# Altium footprint library PLC1.PcbLib: 122 footprints (part 8 of 8)
Each footprint in its own frame and in the unit in brackets; x right, y up, seen from the top. Pads: shape width x height; smd on the part's side, far side on the other; paste and mask are expansions set on the pad; w line width, h text height; cw(c..) or ccw(c..) is an arc to the next point about the centre after c.
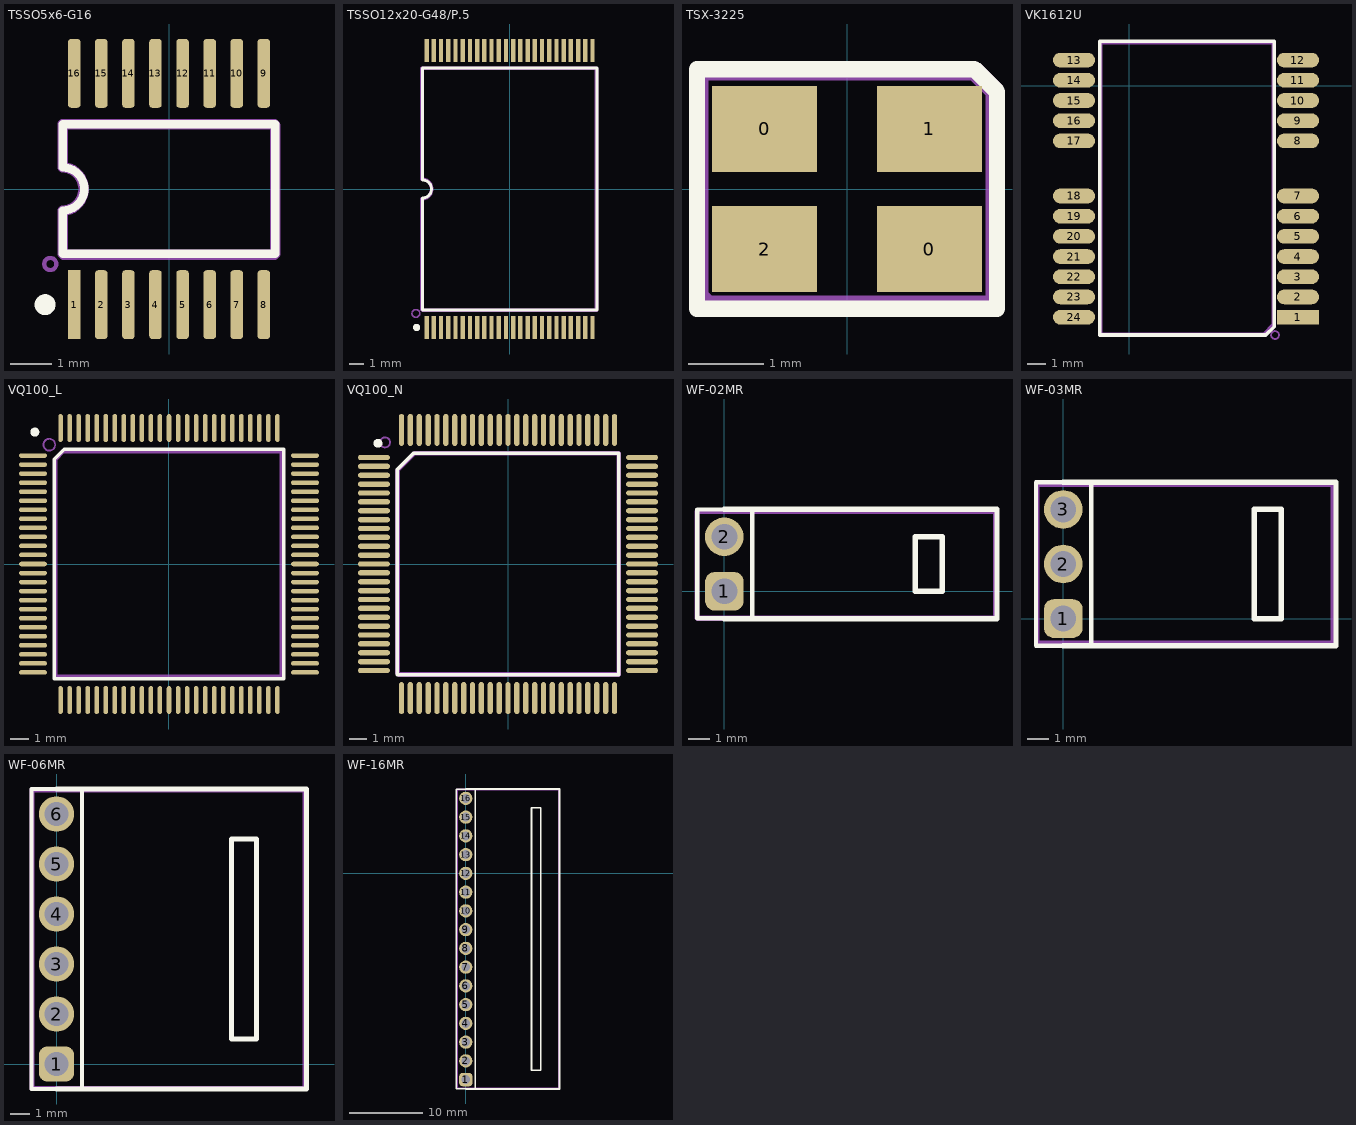
[diagram p7: the footprints below, top view; thin cyan lines are the x and y axes]

## TSSO5x6-G16 [mm] "Shrink Small Outline; 16 Leads; Body Width 4.4 mm; Pitch 0.65 mm"
height 1.1
pads (16):
  rect 0.3x1.65 smd: 1(-2.275,-2.775)
  rrect50% 0.3x1.65 smd: 2(-1.625,-2.775) 3(-0.975,-2.775) 4(-0.325,-2.775) 5(0.325,-2.775) 6(0.975,-2.775) 7(1.625,-2.775) 8(2.275,-2.775) 9(2.275,2.775) 10(1.625,2.775) 11(0.975,2.775) 12(0.325,2.775) 13(-0.325,2.775) 14(-0.975,2.775) 15(-1.625,2.775) 16(-2.275,2.775)
Top Overlay:
  circle w0.25: c-2.975,-2.775 r0.125
  lines w0.2: -2.55,-1.55 -2.55,-0.517 ccw(c-2.55,0) -2.55,0.517 -2.55,1.55 2.55,1.55 2.55,-1.55 -2.55,-1.55
Top Assy:
  circle w0.1: c-2.85,-1.8 r0.146
  lines w0.254: -2.55,-1.55 -2.55,-0.525 ccw(c-2.576,0) -2.55,0.525 -2.55,1.55 2.525,1.55 2.55,1.525 2.55,-1.55 2.525,-1.575 -2.525,-1.575 -2.55,-1.55
  text ".Designator" at -2.3,-1.075 h0.7
3D body "User Library-TSSOP-16.step": height 1, standoff 0, extent -2.5,-3.175 2.5,3.225

## TSSO12x20-G48/P.5 [mm] "Shrink Small Outline; 48 Leads; Body Width 18.4 mm; Pitch 0.5 mm"
height 1.2
pads (48):
  rect 0.3x1.6 smd: 1(-5.75,-9.6) 2(-5.25,-9.6) 3(-4.75,-9.6) 4(-4.25,-9.6) 5(-3.75,-9.6) 6(-3.25,-9.6) 7(-2.75,-9.6) 8(-2.25,-9.6) 9(-1.75,-9.6) 10(-1.25,-9.6) 11(-0.75,-9.6) 12(-0.25,-9.6) 13(0.25,-9.6) 14(0.75,-9.6) 15(1.25,-9.6) 16(1.75,-9.6) 17(2.25,-9.6) 18(2.75,-9.6) 19(3.25,-9.6) 20(3.75,-9.6) 21(4.25,-9.6) 22(4.75,-9.6) 23(5.25,-9.6) 24(5.75,-9.6) 25(5.75,9.6) 26(5.25,9.6) 27(4.75,9.6) 28(4.25,9.6) 29(3.75,9.6) 30(3.25,9.6) 31(2.75,9.6) 32(2.25,9.6) 33(1.75,9.6) 34(1.25,9.6) 35(0.75,9.6) 36(0.25,9.6) 37(-0.25,9.6) 38(-0.75,9.6) 39(-1.25,9.6) 40(-1.75,9.6) 41(-2.25,9.6) 42(-2.75,9.6) 43(-3.25,9.6) 44(-3.75,9.6) 45(-4.25,9.6) 46(-4.75,9.6) 47(-5.25,9.6) 48(-5.75,9.6)
Top Overlay:
  circle w0.25: c-6.45,-9.6 r0.125
  lines w0.2: -6.05,-8.4 6.05,-8.4 6.05,8.4 -6.05,8.4 -6.05,0.635 cw(c-6.05,0) -6.05,-0.635 -6.05,-8.4
Top Assy:
  circle w0.1: c-6.5,-8.625 r0.27
  lines w0.254: -6.075,-8.35 -6.025,-8.4 6.025,-8.4 6.025,8.35 6,8.375 -6.075,8.375 -6.075,0.675 cw(c-6.075,0) -6.075,-0.675 -6.075,-8.35
  text ".Designator" at -3.15,-0.25 h0.7
3D body "User Library-TSOP48.step": height 1.2, standoff -0.06, extent -6.05,-10.05 6.05,10.05

## TSX-3225 [mm]
height 1.5
pads (4):
  rect 1.4x1.15 smd: 0(-1.1,0.8) 0(1.1,-0.8) 1(1.1,0.8) 2(-1.1,-0.8)
Top Overlay:
  lines w0.22: -2,-1.6 2,-1.6 2,1.3 1.7,1.6 -2,1.6 -2,-1.6
Top Assy:
  lines w0.254: -1.975,-1.425 -1.85,-1.55 1.925,-1.55 1.975,-1.5 1.975,1.3 1.7,1.575 -1.975,1.575 -1.975,-1.425
  text ".Designator" at -1.725,-0.275 h0.7
3D body "User Library-tsx-3225-1.step": height 0.6, standoff 0, extent -1.625,-1.25 1.575,1.25

## VK1612U [mm]
pads (24):
  rect 2.3x0.8 smd: 1(9.2,-12.6)
  oval 2.3x0.8 smd: 2(9.2,-11.5) 3(9.2,-10.4) 4(9.2,-9.3) 5(9.2,-8.2) 6(9.2,-7.1) 7(9.2,-6) 8(9.2,-3) 9(9.2,-1.9) 10(9.2,-0.8) 11(9.2,0.3) 12(9.2,1.4) 13(-3,1.4) 14(-3,0.3) 15(-3,-0.8) 16(-3,-1.9) 17(-3,-3) 18(-3,-6) 19(-3,-7.1) 20(-3,-8.2) 21(-3,-9.3) 22(-3,-10.4) 23(-3,-11.5) 24(-3,-12.6)
Top Overlay:
  lines w0.2: -1.6,-13.575 7.45,-13.575 7.9,-13.125 7.9,2.425 5.45,2.425 0.85,2.425 -1.6,2.425 -1.6,-13.575
Top Assy:
  circle w0.1: c7.95,-13.575 r0.215
  lines w0.254: -1.575,2.325 -1.575,-13.525 -1.55,-13.55 7.35,-13.55 7.875,-13.025 7.875,2.35 7.85,2.375 -1.525,2.375
  text ".Designator" at 3.425,-10.3 h0.7
3D body "User Library-neo-m8n.step": height 2.4, standoff 0, extent -2.9,-13.6 9.3,2.4

## VQ100_L [mm] "100-Pin Very Thin Quad Flat Pack (VQ100), IPC High Density"
height 1.2
pads (100):
  oval 1.55x0.25 smd: 1(-7.525,6) 2(-7.525,5.5) 3(-7.525,5) 4(-7.525,4.5) 5(-7.525,4) 6(-7.525,3.5) 7(-7.525,3) 8(-7.525,2.5) 9(-7.525,2) 10(-7.525,1.5) 11(-7.525,1) 12(-7.525,0.5) 13(-7.525,0) 14(-7.525,-0.5) 15(-7.525,-1) 16(-7.525,-1.5) 17(-7.525,-2) 18(-7.525,-2.5) 19(-7.525,-3) 20(-7.525,-3.5) 21(-7.525,-4) 22(-7.525,-4.5) 23(-7.525,-5) 24(-7.525,-5.5) 25(-7.525,-6) 51(7.525,-6) 52(7.525,-5.5) 53(7.525,-5) 54(7.525,-4.5) 55(7.525,-4) 56(7.525,-3.5) 57(7.525,-3) 58(7.525,-2.5) 59(7.525,-2) 60(7.525,-1.5) 61(7.525,-1) 62(7.525,-0.5) 63(7.525,0) 64(7.525,0.5) 65(7.525,1) 66(7.525,1.5) 67(7.525,2) 68(7.525,2.5) 69(7.525,3) 70(7.525,3.5) 71(7.525,4) 72(7.525,4.5) 73(7.525,5) 74(7.525,5.5) 75(7.525,6)
  oval 0.25x1.55 smd: 26(-6,-7.525) 27(-5.5,-7.525) 28(-5,-7.525) 29(-4.5,-7.525) 30(-4,-7.525) 31(-3.5,-7.525) 32(-3,-7.525) 33(-2.5,-7.525) 34(-2,-7.525) 35(-1.5,-7.525) 36(-1,-7.525) 37(-0.5,-7.525) 38(0,-7.525) 39(0.5,-7.525) 40(1,-7.525) 41(1.5,-7.525) 42(2,-7.525) 43(2.5,-7.525) 44(3,-7.525) 45(3.5,-7.525) 46(4,-7.525) 47(4.5,-7.525) 48(5,-7.525) 49(5.5,-7.525) 50(6,-7.525) 76(6,7.525) 77(5.5,7.525) 78(5,7.525) 79(4.5,7.525) 80(4,7.525) 81(3.5,7.525) 82(3,7.525) 83(2.5,7.525) 84(2,7.525) 85(1.5,7.525) 86(1,7.525) 87(0.5,7.525) 88(0,7.525) 89(-0.5,7.525) 90(-1,7.525) 91(-1.5,7.525) 92(-2,7.525) 93(-2.5,7.525) 94(-3,7.525) 95(-3.5,7.525) 96(-4,7.525) 97(-4.5,7.525) 98(-5,7.525) 99(-5.5,7.525) 100(-6,7.525)
Top Overlay:
  circle w0.25: c-7.425,7.3 r0.125
  lines w0.2: -6.35,-6.35 -6.35,5.8 -5.8,6.35 6.35,6.35 6.35,-6.35 -6.35,-6.35
Top Assy:
  circle w0.1: c-6.625,6.6 r0.326
  lines w0.254: -6.3,-6.225 -6.3,5.775 -6.3,5.8 -5.85,6.25 6.225,6.25 6.25,6.225 6.25,-6.25 -6.275,-6.25 -6.3,-6.225
  text ".Designator" at -3.425,-0.15 h0.7

## VQ100_N [mm] "100-Pin Very Thin Quad Flat Pack (VQ100), IPC Medium Density"
height 1.2
pads (100):
  oval 1.8x0.3 smd: 1(-7.55,6) 2(-7.55,5.5) 3(-7.55,5) 4(-7.55,4.5) 5(-7.55,4) 6(-7.55,3.5) 7(-7.55,3) 8(-7.55,2.5) 9(-7.55,2) 10(-7.55,1.5) 11(-7.55,1) 12(-7.55,0.5) 13(-7.55,0) 14(-7.55,-0.5) 15(-7.55,-1) 16(-7.55,-1.5) 17(-7.55,-2) 18(-7.55,-2.5) 19(-7.55,-3) 20(-7.55,-3.5) 21(-7.55,-4) 22(-7.55,-4.5) 23(-7.55,-5) 24(-7.55,-5.5) 25(-7.55,-6) 51(7.55,-6) 52(7.55,-5.5) 53(7.55,-5) 54(7.55,-4.5) 55(7.55,-4) 56(7.55,-3.5) 57(7.55,-3) 58(7.55,-2.5) 59(7.55,-2) 60(7.55,-1.5) 61(7.55,-1) 62(7.55,-0.5) 63(7.55,0) 64(7.55,0.5) 65(7.55,1) 66(7.55,1.5) 67(7.55,2) 68(7.55,2.5) 69(7.55,3) 70(7.55,3.5) 71(7.55,4) 72(7.55,4.5) 73(7.55,5) 74(7.55,5.5) 75(7.55,6)
  oval 0.3x1.8 smd: 26(-6,-7.55) 27(-5.5,-7.55) 28(-5,-7.55) 29(-4.5,-7.55) 30(-4,-7.55) 31(-3.5,-7.55) 32(-3,-7.55) 33(-2.5,-7.55) 34(-2,-7.55) 35(-1.5,-7.55) 36(-1,-7.55) 37(-0.5,-7.55) 38(0,-7.55) 39(0.5,-7.55) 40(1,-7.55) 41(1.5,-7.55) 42(2,-7.55) 43(2.5,-7.55) 44(3,-7.55) 45(3.5,-7.55) 46(4,-7.55) 47(4.5,-7.55) 48(5,-7.55) 49(5.5,-7.55) 50(6,-7.55) 76(6,7.55) 77(5.5,7.55) 78(5,7.55) 79(4.5,7.55) 80(4,7.55) 81(3.5,7.55) 82(3,7.55) 83(2.5,7.55) 84(2,7.55) 85(1.5,7.55) 86(1,7.55) 87(0.5,7.55) 88(0,7.55) 89(-0.5,7.55) 90(-1,7.55) 91(-1.5,7.55) 92(-2,7.55) 93(-2.5,7.55) 94(-3,7.55) 95(-3.5,7.55) 96(-4,7.55) 97(-4.5,7.55) 98(-5,7.55) 99(-5.5,7.55) 100(-6,7.55)
Top Overlay:
  circle w0.25: c-7.325,6.8 r0.125
  lines w0.2: -6.25,-6.25 6.25,-6.25 6.25,6.25 -5.3,6.25 -6.25,5.3 -6.25,-6.25
Top Assy:
  circle w0.1: c-6.925,6.85 r0.283
  lines w0.254: -6.225,-6.15 -6.15,-6.225 6.25,-6.225 6.25,6.225 6.225,6.25 -5.25,6.25 -6.225,5.275 -6.225,-6.15
  text ".Designator" at -3.65,-0.175 h0.7

## WF-02MR [mm] "WF-02MR"
height 5.8
pads (2):
  rrect50% 1.8x1.8 hole 1.2: 1(0,0)
  round 1.8 hole 1.2: 2(0,2.54)
Top Overlay:
  lines w0.2: -1.27,-1.26 1.3,-1.26 1.3,3.81 -1.27,3.81 -1.27,-1.26
  lines w0.254: 0,-1.27 12.7,-1.27 12.7,3.81 0,3.81 ; 8.89,0 8.89,2.54 10.16,2.54 10.16,0 8.89,0
Top Assy:
  lines w0.254: -1.275,3.7 -1.275,-1.225 -1.25,-1.25 12.65,-1.25 12.65,3.725 -1.15,3.725
  text ".Designator" at 1.6,0.9 h0.7
3D body "User Library-PLS-1R.step": height 5.45, standoff -3, extent -1.27,-1.28 7.35,1.26
3D body "User Library-PLS-1R.step": height 5.45, standoff -3, extent -1.27,1.27 7.35,3.81

## WF-03MR [mm] "WF-03MR"
height 5.8
pads (3):
  rrect50% 1.8x1.8 hole 1.2: 1(0,0)
  round 1.8 hole 1.2: 2(0,2.54) 3(0,5.08)
Top Overlay:
  lines w0.2: 0,6.35 -1.27,6.35 -1.27,-1.26 1.3,-1.26 1.3,6.35
  lines w0.254: 0,-1.27 12.7,-1.27 12.7,6.35 0,6.35 ; 8.89,0 8.89,5.08 10.16,5.08 10.16,0 8.89,0
Top Assy:
  lines w0.254: -1.225,-1.1 -1.175,-1.15 12.575,-1.15 12.575,6.1 12.575,6.2 12.525,6.25 -1.225,6.25 -1.225,-1.1
  text ".Designator" at 1.6,2.3 h0.7
3D body "User Library-PLS-1R.step": height 5.45, standoff -3, extent -1.27,3.81 7.35,6.35
3D body "User Library-PLS-1R.step": height 5.45, standoff -3, extent -1.27,-1.28 7.35,1.26
3D body "User Library-PLS-1R.step": height 5.45, standoff -3, extent -1.27,1.27 7.35,3.81

## WF-06MR [mm] "WF-06MR"
height 5.8
pads (6):
  rrect50% 1.8x1.8 hole 1.2: 1(0,0)
  round 1.8 hole 1.2: 2(0,2.54) 3(0,5.08) 4(0,7.62) 5(0,10.16) 6(0,12.7)
Top Overlay:
  lines w0.2: -1.27,-1.26 -1.27,13.97 1.3,13.97 1.3,-1.26 -1.27,-1.26
  lines w0.254: 0,-1.27 12.7,-1.27 12.7,13.97 0,13.97 ; 8.89,1.27 10.16,1.27 10.16,11.43 8.89,11.43 8.89,1.27
Top Assy:
  lines w0.254: -1.25,-1.25 12.6,-1.25 12.625,-1.225 12.625,13.9 12.65,13.925 -1.25,13.925 -1.25,-1.25
3D body "User Library-PLS-1R.step": height 5.45, standoff -3, extent -1.27,8.88 7.35,11.42
3D body "User Library-PLS-1R.step": height 5.45, standoff -3, extent -1.27,11.43 7.35,13.97
3D body "User Library-PLS-1R.step": height 5.45, standoff -3, extent -1.27,6.35 7.35,8.89
3D body "User Library-PLS-1R.step": height 5.45, standoff -3, extent -1.27,3.8 7.35,6.34
3D body "User Library-PLS-1R.step": height 5.45, standoff -3, extent -1.27,-1.28 7.35,1.26
3D body "User Library-PLS-1R.step": height 5.45, standoff -3, extent -1.27,1.27 7.35,3.81

## WF-16MR [mm] "WF-16MR"
height 5.8
pads (16):
  rrect50% 1.8x1.8 hole 1.2: 1(0,-27.94)
  round 1.8 hole 1.2: 2(0,-25.4) 3(0,-22.86) 4(0,-20.32) 5(0,-17.78) 6(0,-15.24) 7(0,-12.7) 8(0,-10.16) 9(0,-7.62) 10(0,-5.08) 11(0,-2.54) 12(0,0) 13(0,2.54) 14(0,5.08) 15(0,7.62) 16(0,10.16)
Top Overlay:
  lines w0.2: -1.27,-29.2 1.3,-29.2 1.3,11.43 -1.27,11.43 -1.27,-29.2
  lines w0.254: 0,-29.21 12.7,-29.21 12.7,11.43 0,11.43 ; 8.89,-26.67 8.89,8.89 10.16,8.89 10.16,-26.67 8.89,-26.67
Top Assy:
  lines w0.254: -1.175,-29.075 -1.15,-29.1 12.6,-29.1 12.6,11.275 12.525,11.35 -1.175,11.35 -1.175,-29.075
3D body "c-0640457-16-s-3d.stp": height 5.87, standoff -3.52, extent -0.254,-29.21 10.795,11.43